# Altium footprint library micromouse pcb library.PcbLib: 68 footprints (part 2 of 5)
Each footprint in its own frame and in the unit in brackets; x right, y up, seen from the top. Pads: shape width x height; smd on the part's side, far side on the other; paste and mask are expansions set on the pad; w line width, h text height; cw(c..) or ccw(c..) is an arc to the next point about the centre after c.
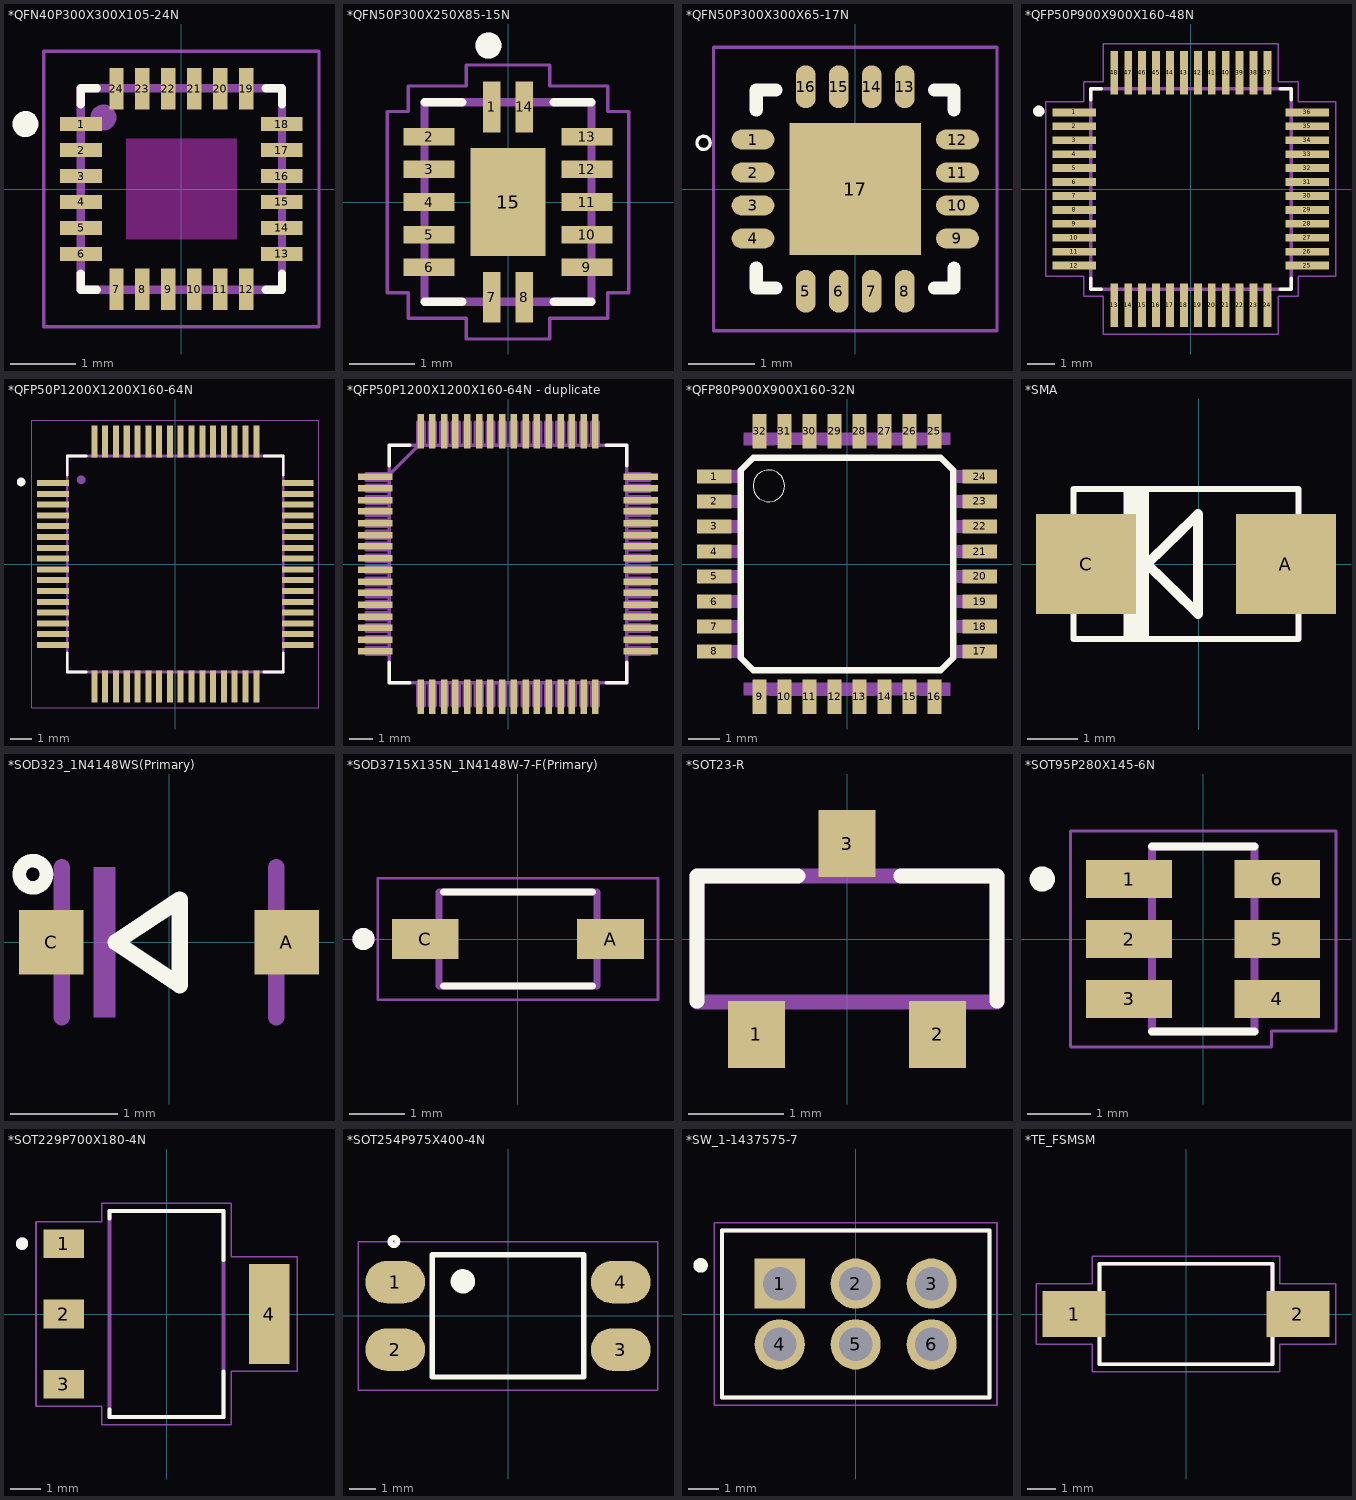
[diagram p1: the footprints below, top view; thin cyan lines are the x and y axes]

## *QFN40P300X300X105-24N [mm]
pads (24):
  rect 0.64x0.22 smd: 1(-1.545,1) 2(-1.545,0.6) 3(-1.545,0.2) 4(-1.545,-0.2) 5(-1.545,-0.6) 6(-1.545,-1) 13(1.545,-1) 14(1.545,-0.6) 15(1.545,-0.2) 16(1.545,0.2) 17(1.545,0.6) 18(1.545,1)
  rect 0.22x0.64 smd: 7(-1,-1.545) 8(-0.6,-1.545) 9(-0.2,-1.545) 10(0.2,-1.545) 11(0.6,-1.545) 12(1,-1.545) 19(1,1.545) 20(0.6,1.545) 21(0.2,1.545) 22(-0.2,1.545) 23(-0.6,1.545) 24(-1,1.545)
Top Overlay:
  circle w0.2: c-2.4,1 r0.1
  lines w0.127: -1.55,-1.3 -1.55,-1.55 -1.3,-1.55 ; -1.55,1.3 -1.55,1.55 -1.3,1.55 ; 1.3,-1.55 1.55,-1.55 1.55,-1.3 ; 1.3,1.55 1.55,1.55 1.55,1.3
Keep-Out Layer:
  region: -0.85,0.77 0.85,0.77 0.85,-0.77 -0.85,-0.77
  region: -0.85,0.77 0.85,0.77 0.85,-0.77 -0.85,-0.77
  region: -0.85,0.77 0.85,0.77 0.85,-0.77 -0.85,-0.77
  region: -0.85,0.77 0.85,0.77 0.85,-0.77 -0.85,-0.77
  region: -0.85,0.77 0.85,0.77 0.85,-0.77 -0.85,-0.77
  region: -0.85,0.77 0.85,0.77 0.85,-0.77 -0.85,-0.77
Mechanical 4:
  circle w0.2: c-1.2,1.1 r0.1
  circle w0.2: c-1.2,1.1 r0.1
  lines w0.127: -1.55,-1.55 1.55,-1.55 ; -1.55,-1.55 -1.55,1.55 ; -1.55,-1.55 1.55,-1.55 ; -1.55,-1.55 -1.55,1.55 ; -1.55,1.55 1.55,1.55 ; -1.55,1.55 1.55,1.55 ; 1.55,-1.55 1.55,1.55 ; 1.55,-1.55 1.55,1.55
Mechanical 16:
  lines w0.05: -2.12,-2.12 2.12,-2.12 2.12,2.12 -2.12,2.12 -2.12,-2.12
3D body "MPU-9250--3DModel-STEP-1.STEP": height 1, standoff -0.05, extent -1.5,-1.5 1.5,1.5

## *QFN50P300X250X85-15N [mm]
pads (15):
  rect 0.27x0.78 smd: 1(-0.25,1.46) 7(-0.25,-1.46) 8(0.25,-1.46) 14(0.25,1.46)
  rect 0.78x0.27 smd: 2(-1.21,1) 3(-1.21,0.5) 4(-1.21,0) 5(-1.21,-0.5) 6(-1.21,-1) 9(1.21,-1) 10(1.21,-0.5) 11(1.21,0) 12(1.21,0.5) 13(1.21,1)
  rect 1.15x1.65 smd: 15(0,0)
Top Overlay:
  circle w0.2: c-0.3,2.4 r0.1
  lines w0.127: -1.28,-1.53 -0.7,-1.53 ; -1.28,1.53 -0.7,1.53 ; 0.7,-1.53 1.28,-1.53 ; 0.7,1.53 1.28,1.53
Top Paste:
  region: -0.38,0.695 0.38,0.695 0.38,0.065 -0.38,0.065
  region: -0.38,-0.065 0.38,-0.065 0.38,-0.695 -0.38,-0.695
Mechanical 4:
  circle w0.2: c-0.3,2.4 r0.1
  circle w0.2: c-0.3,2.4 r0.1
  lines w0.127: -1.28,-1.53 -1.28,1.53 ; -1.28,-1.53 1.28,-1.53 ; -1.28,-1.53 -1.28,1.53 ; -1.28,-1.53 1.28,-1.53 ; -1.28,1.53 1.28,1.53 ; -1.28,1.53 1.28,1.53 ; 1.28,-1.53 1.28,1.53 ; 1.28,-1.53 1.28,1.53
Mechanical 16:
  lines w0.05: -1.85,-1.39 -1.85,1.39 -1.53,1.39 -1.53,1.78 -0.64,1.78 -0.64,2.1 0.64,2.1 0.64,1.78 1.53,1.78 1.53,1.39 1.85,1.39 1.85,-1.39 1.53,-1.39 1.53,-1.78 0.64,-1.78 0.64,-2.1 -0.64,-2.1 -0.64,-1.78 -1.53,-1.78 -1.53,-1.39 -1.85,-1.39
3D body "FXL5T244BQX--3DModel-STEP-56544.STEP": height 0.75, standoff -0.05, extent -1.25,-1.5 1.25,1.5

## *QFN50P300X300X65-17N [mm]
pads (17):
  oval 0.65x0.3 smd: 1(-1.55,0.75) 2(-1.55,0.25) 3(-1.55,-0.25) 4(-1.55,-0.75) 9(1.55,-0.75) 10(1.55,-0.25) 11(1.55,0.25) 12(1.55,0.75)
  oval 0.3x0.65 smd: 5(-0.75,-1.55) 6(-0.25,-1.55) 7(0.25,-1.55) 8(0.75,-1.55) 13(0.75,1.55) 14(0.25,1.55) 15(-0.25,1.55) 16(-0.75,1.55)
  rect 2x2 smd: 17(0,0)
Top Overlay:
  circle w0.05: c-2.3,0.7 r0.1
  lines w0.2: -1.5,-1.2 -1.5,-1.5 -1.2,-1.5 ; -1.5,1.2 -1.5,1.5 -1.2,1.5 ; 1.2,-1.5 1.5,-1.5 1.5,-1.2 ; 1.2,1.5 1.5,1.5 1.5,1.2
Mechanical 16:
  lines w0.05: -2.15,-2.15 2.15,-2.15 2.15,2.15 -2.15,2.15 -2.15,-2.15
3D body "QFN-16 (3x3).stp": height 0.81, standoff -0.05, extent -1.5,-1.5 1.5,1.5

## *QFP50P900X900X160-48N [mm]
pads (48):
  rect 1.56x0.28 smd: 1(-4.18,2.75) 2(-4.18,2.25) 3(-4.18,1.75) 4(-4.18,1.25) 5(-4.18,0.75) 6(-4.18,0.25) 7(-4.18,-0.25) 8(-4.18,-0.75) 9(-4.18,-1.25) 10(-4.18,-1.75) 11(-4.18,-2.25) 12(-4.18,-2.75) 25(4.18,-2.75) 26(4.18,-2.25) 27(4.18,-1.75) 28(4.18,-1.25) 29(4.18,-0.75) 30(4.18,-0.25) 31(4.18,0.25) 32(4.18,0.75) 33(4.18,1.25) 34(4.18,1.75) 35(4.18,2.25) 36(4.18,2.75)
  rect 0.28x1.56 smd: 13(-2.75,-4.18) 14(-2.25,-4.18) 15(-1.75,-4.18) 16(-1.25,-4.18) 17(-0.75,-4.18) 18(-0.25,-4.18) 19(0.25,-4.18) 20(0.75,-4.18) 21(1.25,-4.18) 22(1.75,-4.18) 23(2.25,-4.18) 24(2.75,-4.18) 37(2.75,4.18) 38(2.25,4.18) 39(1.75,4.18) 40(1.25,4.18) 41(0.75,4.18) 42(0.25,4.18) 43(-0.25,4.18) 44(-0.75,4.18) 45(-1.25,4.18) 46(-1.75,4.18) 47(-2.25,4.18) 48(-2.75,4.18)
Top Overlay:
  circle w0.2: c-5.461,2.794 r0.1
  lines w0.127: -3.6,-3.21 -3.6,-3.6 -3.21,-3.6 ; -3.6,3.21 -3.6,3.6 -3.21,3.6 ; 3.21,-3.6 3.6,-3.6 3.6,-3.21 ; 3.21,3.6 3.6,3.6 3.6,3.21
Mechanical 4:
  circle w0.2: c-5.461,2.794 r0.1
  circle w0.2: c-5.461,2.794 r0.1
  lines w0.127: -3.6,-3.6 3.6,-3.6 ; -3.6,-3.6 -3.6,3.6 ; -3.6,-3.6 3.6,-3.6 ; -3.6,-3.6 -3.6,3.6 ; -3.6,3.6 3.6,3.6 ; -3.6,3.6 3.6,3.6 ; 3.6,-3.6 3.6,3.6 ; 3.6,-3.6 3.6,3.6
Mechanical 16:
  lines w0.05: -5.21,-3.14 -5.21,3.14 -3.85,3.14 -3.85,3.85 -3.14,3.85 -3.14,5.21 3.14,5.21 3.14,3.85 3.85,3.85 3.85,3.14 5.21,3.14 5.21,-3.14 3.85,-3.14 3.85,-3.85 3.14,-3.85 3.14,-5.21 -3.14,-5.21 -3.14,-3.85 -3.85,-3.85 -3.85,-3.14 -5.21,-3.14
3D body "STM32-LQFP48.STEP": height 1.5, standoff 0, extent -4.453,-4.555 4.547,4.445

## *QFP50P1200X1200X160-64N [mm]
pads (64):
  rect 1.47x0.28 smd: 1(-5.67,3.75) 2(-5.67,3.25) 3(-5.67,2.75) 4(-5.67,2.25) 5(-5.67,1.75) 6(-5.67,1.25) 7(-5.67,0.75) 8(-5.67,0.25) 9(-5.67,-0.25) 10(-5.67,-0.75) 11(-5.67,-1.25) 12(-5.67,-1.75) 13(-5.67,-2.25) 14(-5.67,-2.75) 15(-5.67,-3.25) 16(-5.67,-3.75) 33(5.67,-3.75) 34(5.67,-3.25) 35(5.67,-2.75) 36(5.67,-2.25) 37(5.67,-1.75) 38(5.67,-1.25) 39(5.67,-0.75) 40(5.67,-0.25) 41(5.67,0.25) 42(5.67,0.75) 43(5.67,1.25) 44(5.67,1.75) 45(5.67,2.25) 46(5.67,2.75) 47(5.67,3.25) 48(5.67,3.75)
  rect 0.28x1.47 smd: 17(-3.75,-5.67) 18(-3.25,-5.67) 19(-2.75,-5.67) 20(-2.25,-5.67) 21(-1.75,-5.67) 22(-1.25,-5.67) 23(-0.75,-5.67) 24(-0.25,-5.67) 25(0.25,-5.67) 26(0.75,-5.67) 27(1.25,-5.67) 28(1.75,-5.67) 29(2.25,-5.67) 30(2.75,-5.67) 31(3.25,-5.67) 32(3.75,-5.67) 49(3.75,5.67) 50(3.25,5.67) 51(2.75,5.67) 52(2.25,5.67) 53(1.75,5.67) 54(1.25,5.67) 55(0.75,5.67) 56(0.25,5.67) 57(-0.25,5.67) 58(-0.75,5.67) 59(-1.25,5.67) 60(-1.75,5.67) 61(-2.25,5.67) 62(-2.75,5.67) 63(-3.25,5.67) 64(-3.75,5.67)
Top Overlay:
  circle w0.2: c-7.14,3.8 r0.1
  lines w0.127: -5,-4.125 -5,-5 -4.125,-5 ; -5,4.125 -5,5 -4.125,5 ; 4.092,-5 5,-5 5,-4.125 ; 4.125,5 5,5 5,4.125
Mechanical 4:
  circle w0.2: c-4.36,3.9 r0.1
  circle w0.2: c-4.36,3.9 r0.1
  lines w0.127: -5,-5 -5,5 ; -5,-5 5,-5 ; -5,-5 -5,5 ; -5,-5 5,-5 ; -5,5 5,5 ; -5,5 5,5 ; 5,-5 5,5 ; 5,-5 5,5
Mechanical 16:
  lines w0.05: -6.655,-6.655 -6.655,6.655 6.655,6.655 6.655,-6.655 -6.655,-6.655
3D body "STM32 LQFP64.step": height 1.6, standoff 0, extent -6.006,-6.006 5.994,5.994

## *QFP50P1200X1200X160-64N - duplicate [mil]
pads (64):
  rect 58x11 smd: 1(-225,148) 2(-225,128) 3(-225,108) 4(-225,89) 5(-225,69) 6(-225,49) 7(-225,30) 8(-225,10) 9(-225,-10) 10(-225,-30) 11(-225,-49) 12(-225,-69) 13(-225,-89) 14(-225,-108) 15(-225,-128) 16(-225,-148) 33(225,-148) 34(225,-128) 35(225,-108) 36(225,-89) 37(225,-69) 38(225,-49) 39(225,-30) 40(225,-10) 41(225,10) 42(225,30) 43(225,49) 44(225,69) 45(225,89) 46(225,108) 47(225,128) 48(225,148)
  rect 11x58 smd: 17(-148,-225) 18(-128,-225) 19(-108,-225) 20(-89,-225) 21(-69,-225) 22(-49,-225) 23(-30,-225) 24(-10,-225) 25(10,-225) 26(30,-225) 27(49,-225) 28(69,-225) 29(89,-225) 30(108,-225) 31(128,-225) 32(148,-225) 49(148,225) 50(128,225) 51(108,225) 52(89,225) 53(69,225) 54(49,225) 55(30,225) 56(10,225) 57(-10,225) 58(-30,225) 59(-49,225) 60(-69,225) 61(-89,225) 62(-108,225) 63(-128,225) 64(-148,225)
Top Overlay:
  lines w6: -201,-166 -201,-201 -166,-201 ; -201,166 -201,201 -166,201 ; 166,-201 201,-201 201,-166 ; 166,201 201,201 201,166
Mechanical 4:
  drawing of 526 lines, arcs and shapes, not listed
3D body "MK20DX256VLH7--3DModel-STEP-56544.STEP": height 62.99, standoff 0, extent -236.56,-236.56 236.58,236.58

## *QFP80P900X900X160-32N [mm]
pads (32):
  rect 1.1x0.45 smd: 1(-4.25,2.8) 2(-4.25,2) 3(-4.25,1.2) 4(-4.25,0.4) 5(-4.25,-0.4) 6(-4.25,-1.2) 7(-4.25,-2) 8(-4.25,-2.8) 17(4.25,-2.8) 18(4.25,-2) 19(4.25,-1.2) 20(4.25,-0.4) 21(4.25,0.4) 22(4.25,1.2) 23(4.25,2) 24(4.25,2.8)
  rect 0.45x1.1 smd: 9(-2.8,-4.25) 10(-2,-4.25) 11(-1.2,-4.25) 12(-0.4,-4.25) 13(0.4,-4.25) 14(1.2,-4.25) 15(2,-4.25) 16(2.8,-4.25) 25(2.8,4.25) 26(2,4.25) 27(1.2,4.25) 28(0.4,4.25) 29(-0.4,4.25) 30(-1.2,4.25) 31(-2,4.25) 32(-2.8,4.25)
Top Overlay:
  circle w0: c-2.5,2.5 r0.505
  lines w0.203: -3.398,-2.998 -3.398,2.998 -2.998,3.398 2.998,3.398 3.398,2.998 3.398,-2.998 2.998,-3.398 -2.998,-3.398 -3.398,-2.998
Mechanical 4:
  drawing of 64 lines, arcs and shapes, not listed
3D body "LQFP32_FPT-32P-M21.stp": height 1.5, standoff 0, extent -4.5,-4.5 4.5,4.5

## *SMA [mm]
pads (2):
  rect 2x2 smd: A(1.75,0) C(-2.25,0)
Top Overlay:
  region: -1.5,1.5 -1,1.5 -1,-1.5 -1.5,-1.5
  region: 2,0.8 2.5,0.8 2.5,-0.8 2,-0.8
  region: -3,0.8 -2.5,0.8 -2.5,-0.8 -3,-0.8
  lines w0.127: -2.5,-1.5 -2.5,1.5 2,1.5 2,-1.5 -2.5,-1.5
  lines w0.203: -1.03,0 -0.007,-1 -0.007,1 -1.03,0
3D body "Diode SMA.stp": height 2.41, standoff 0, extent -2.921,-1.46 2.359,1.46

## *SOD323_1N4148WS(Primary) [mm]
pads (2):
  rect 0.6x0.6 smd: A(1.1,0) C(-1.1,0)
Top Overlay:
  circle w0.127: c-1.27,0.635 r0.127
  lines w0.152: -0.5,0 0.1,0.4 0.1,-0.4 -0.5,0
Mechanical 4:
  region: -0.701,0.7 -0.5,0.7 -0.5,-0.701 -0.701,-0.701
  region: -0.701,0.7 -0.5,0.7 -0.5,-0.701 -0.701,-0.701
  lines w0.152: -1,-0.7 -1,0.7 -1,-0.7 ; 1,-0.7 1,0.7 1,-0.7
3D body "1N914BWS--3DModel-STEP-56544.STEP": height 0.89, standoff -0.01, extent -1.25,-0.625 1.25,0.625

## *SOD3715X135N_1N4148W-7-F(Primary) [mm]
pads (2):
  rect 1.21x0.73 smd: A(1.68,0) C(-1.68,0)
Top Overlay:
  circle w0.2: c-2.8,0 r0.1
  lines w0.127: -1.35,-0.85 1.35,-0.85 ; -1.35,0.85 1.35,0.85
Mechanical 4:
  circle w0.2: c-2.8,0 r0.1
  circle w0.2: c-2.8,0 r0.1
  lines w0.127: -1.43,-0.85 1.43,-0.85 ; -1.43,-0.85 -1.43,0.85 ; -1.43,-0.85 1.43,-0.85 ; -1.43,-0.85 -1.43,0.85 ; -1.43,0.85 1.43,0.85 ; -1.43,0.85 1.43,0.85 ; 1.43,-0.85 1.43,0.85 ; 1.43,-0.85 1.43,0.85
Mechanical 16:
  lines w0.05: -2.54,-1.1 2.54,-1.1 2.54,1.1 -2.54,1.1 -2.54,-1.1
3D body "1N5819HW-7-F--3DModel-STEP-56544.STEP": height 1.51, standoff -0.02, extent -1.825,-0.775 1.825,0.775

## *SOT23-R [mm]
pads (3):
  rect 0.6x0.7 smd: 1(-0.95,-1) 2(0.95,-1) 3(0,1)
Top Overlay:
  lines w0.152: -1.572,-0.652 -1.572,0.66 -0.514,0.66 ; 0.564,0.66 1.572,0.66 1.572,-0.652
Mechanical 4:
  region: -0.229,1.295 0.229,1.295 0.229,0.711 -0.229,0.711
  region: 0.711,-0.711 1.168,-0.711 1.168,-1.296 0.711,-1.296
  region: -1.17,-0.711 -0.711,-0.711 -0.711,-1.297 -1.17,-1.297
  region: -0.229,1.295 0.229,1.295 0.229,0.711 -0.229,0.711
  region: 0.711,-0.711 1.168,-0.711 1.168,-1.296 0.711,-1.296
  region: -1.17,-0.711 -0.711,-0.711 -0.711,-1.297 -1.17,-1.297
  lines w0.152: -1.572,-0.66 1.572,-0.66 ; -1.572,-0.66 -1.572,0.66 ; -1.572,-0.66 1.572,-0.66 ; -1.572,-0.66 -1.572,0.66 ; -1.572,0.66 1.572,0.66 ; -1.572,0.66 1.572,0.66 ; 1.572,-0.66 1.572,0.66 ; 1.572,-0.66 1.572,0.66
3D body "MMBTH10LT3G--3DModel-STEP-56544.STEP": height 1.07, standoff -0.04, extent -1.45,-1.2 1.45,1.2

## *SOT95P280X145-6N [mm]
pads (6):
  rect 1.36x0.6 smd: 1(-1.175,0.95) 2(-1.175,0) 3(-1.175,-0.95) 4(1.175,-0.95) 5(1.175,0) 6(1.175,0.95)
Top Overlay:
  circle w0.2: c-2.55,0.95 r0.1
  lines w0.127: -0.813,-1.463 0.813,-1.463 ; -0.813,1.463 0.813,1.463
Mechanical 4:
  circle w0.2: c-1.3,0.95 r0.1
  circle w0.2: c-1.3,0.95 r0.1
  lines w0.127: -0.813,-1.463 -0.813,1.463 ; -0.813,-1.463 0.813,-1.463 ; -0.813,-1.463 -0.813,1.463 ; -0.813,-1.463 0.813,-1.463 ; -0.813,1.463 0.813,1.463 ; -0.813,1.463 0.813,1.463 ; 0.813,-1.463 0.813,1.463 ; 0.813,-1.463 0.813,1.463
Mechanical 16:
  lines w0.05: -2.105,-1.713 -2.105,1.713 2.105,1.713 2.105,-1.46 1.08,-1.46 1.08,-1.713 -2.105,-1.713
3D body "USBLC6-2SC6Y--3DModel-STEP-56544.STEP": height 1.42, standoff -0.03, extent -1.425,-1.462 1.375,1.463

## *SOT229P700X180-4N [mm]
pads (4):
  rect 1.31x0.93 smd: 1(-3.345,2.29) 2(-3.345,0) 3(-3.345,-2.29)
  rect 1.31x3.24 smd: 4(3.345,0)
Top Overlay:
  circle w0.2: c-4.703,2.29 r0.1
  lines w0.127: -1.86,-3.11 -1.86,-3.36 1.86,-3.36 1.86,-1.87 ; -1.86,3.1 -1.86,3.36 1.86,3.36 1.86,1.76
Mechanical 4:
  circle w0.2: c-4.703,2.29 r0.1
  circle w0.2: c-4.703,2.29 r0.1
  lines w0.127: -1.86,-3.36 -1.86,3.36 ; -1.86,-3.36 1.86,-3.36 ; -1.86,-3.36 -1.86,3.36 ; -1.86,-3.36 1.86,-3.36 ; -1.86,3.36 1.86,3.36 ; -1.86,3.36 1.86,3.36 ; 1.86,-3.36 1.86,3.36 ; 1.86,-3.36 1.86,3.36
Mechanical 16:
  lines w0.05: -4.25,-3.01 -2.11,-3.01 -2.11,-3.61 2.11,-3.61 2.11,-1.87 4.25,-1.87 4.25,1.87 2.11,1.87 2.11,3.61 -2.11,3.61 -2.11,3.01 -4.25,3.01 -4.25,-3.01
3D body "AMS1117-3.3--3DModel-STEP-56544.STEP": height 1.78, standoff -0.03, extent -3.626,-3.251 3.372,3.251

## *SOT254P975X400-4N [mm]
pads (4):
  oval 2.25x1.6 smd: 1(-4.25,1.27) 2(-4.25,-1.27) 3(4.25,-1.27) 4(4.25,1.27)
Top Overlay:
  circle w0.2: c-4.3,2.8 r0.141
  circle w0.2: c-1.7,1.3 r0.361
  region: -2.001,1.6 -1.4,1.6 -1.4,1.001 -2.001,1.001
  lines w0.2: -2.85,-2.3 -2.85,2.3 2.85,2.3 2.85,-2.3 -2.85,-2.3
Mechanical 16:
  lines w0.052: -5.65,-2.8 -5.65,2.8 5.65,2.8 5.65,-2.8 -5.65,-2.8
3D body "PC817--3DModel-STEP-56544.STEP": height 3.87, standoff -0.01, extent -5.025,-2.3 5.025,2.3

## *SW_1-1437575-7 [mm]
pads (6):
  rect 1.65x1.65 hole 1.1: 1(-2.5,1)
  round 1.65 hole 1.1: 2(0,1) 3(2.5,1) 4(-2.5,-1) 5(0,-1) 6(2.5,-1)
Top Overlay:
  circle w0.24: c-5.1,1.6 r0.12
  lines w0.127: -4.4,-2.75 4.4,-2.75 4.4,2.75 -4.4,2.75 -4.4,-2.75
Mechanical 4:
  lines w0.127: -4.4,-2.75 4.4,-2.75 ; -4.4,-2.75 -4.4,2.75 ; -4.4,-2.75 4.4,-2.75 ; -4.4,-2.75 -4.4,2.75 ; -4.4,2.75 4.4,2.75 ; -4.4,2.75 4.4,2.75 ; 4.4,-2.75 4.4,2.75 ; 4.4,-2.75 4.4,2.75
Mechanical 16:
  lines w0.05: -4.65,-3 4.65,-3 4.65,3 -4.65,3 -4.65,-3

## *TE_FSMSM [mm]
pads (2):
  rect 2.19x1.6 smd: 1(-3.886,0) 2(3.886,0)
Top Overlay:
  lines w0.127: -3,-1.75 3,-1.75 3,1.75 -3,1.75 -3,-1.75
Mechanical 4:
  lines w0.127: -3,-1.75 3,-1.75 ; -3,-1.75 -3,1.75 ; -3,-1.75 3,-1.75 ; -3,-1.75 -3,1.75 ; -3,1.75 3,1.75 ; -3,1.75 3,1.75 ; 3,-1.75 3,1.75 ; 3,-1.75 3,1.75
Mechanical 16:
  lines w0.05: -5.207,-1.05 -5.207,1.05 -3.25,1.05 -3.25,2 3.25,2 3.25,1.05 5.207,1.05 5.207,-1.05 3.25,-1.05 3.25,-2 -3.25,-2 -3.25,-1.05 -5.207,-1.05
3D body "6x3mm Button.stp": height 2.54, standoff -0.03, extent -3.886,-1.791 3.886,1.791